# Altium footprint library ZHZ_Balance.PcbLib: 29 footprints (part 1 of 2)
Each footprint in its own frame and in the unit in brackets; x right, y up, seen from the top. Pads: shape width x height; smd on the part's side, far side on the other; paste and mask are expansions set on the pad; w line width, h text height; cw(c..) or ccw(c..) is an arc to the next point about the centre after c.
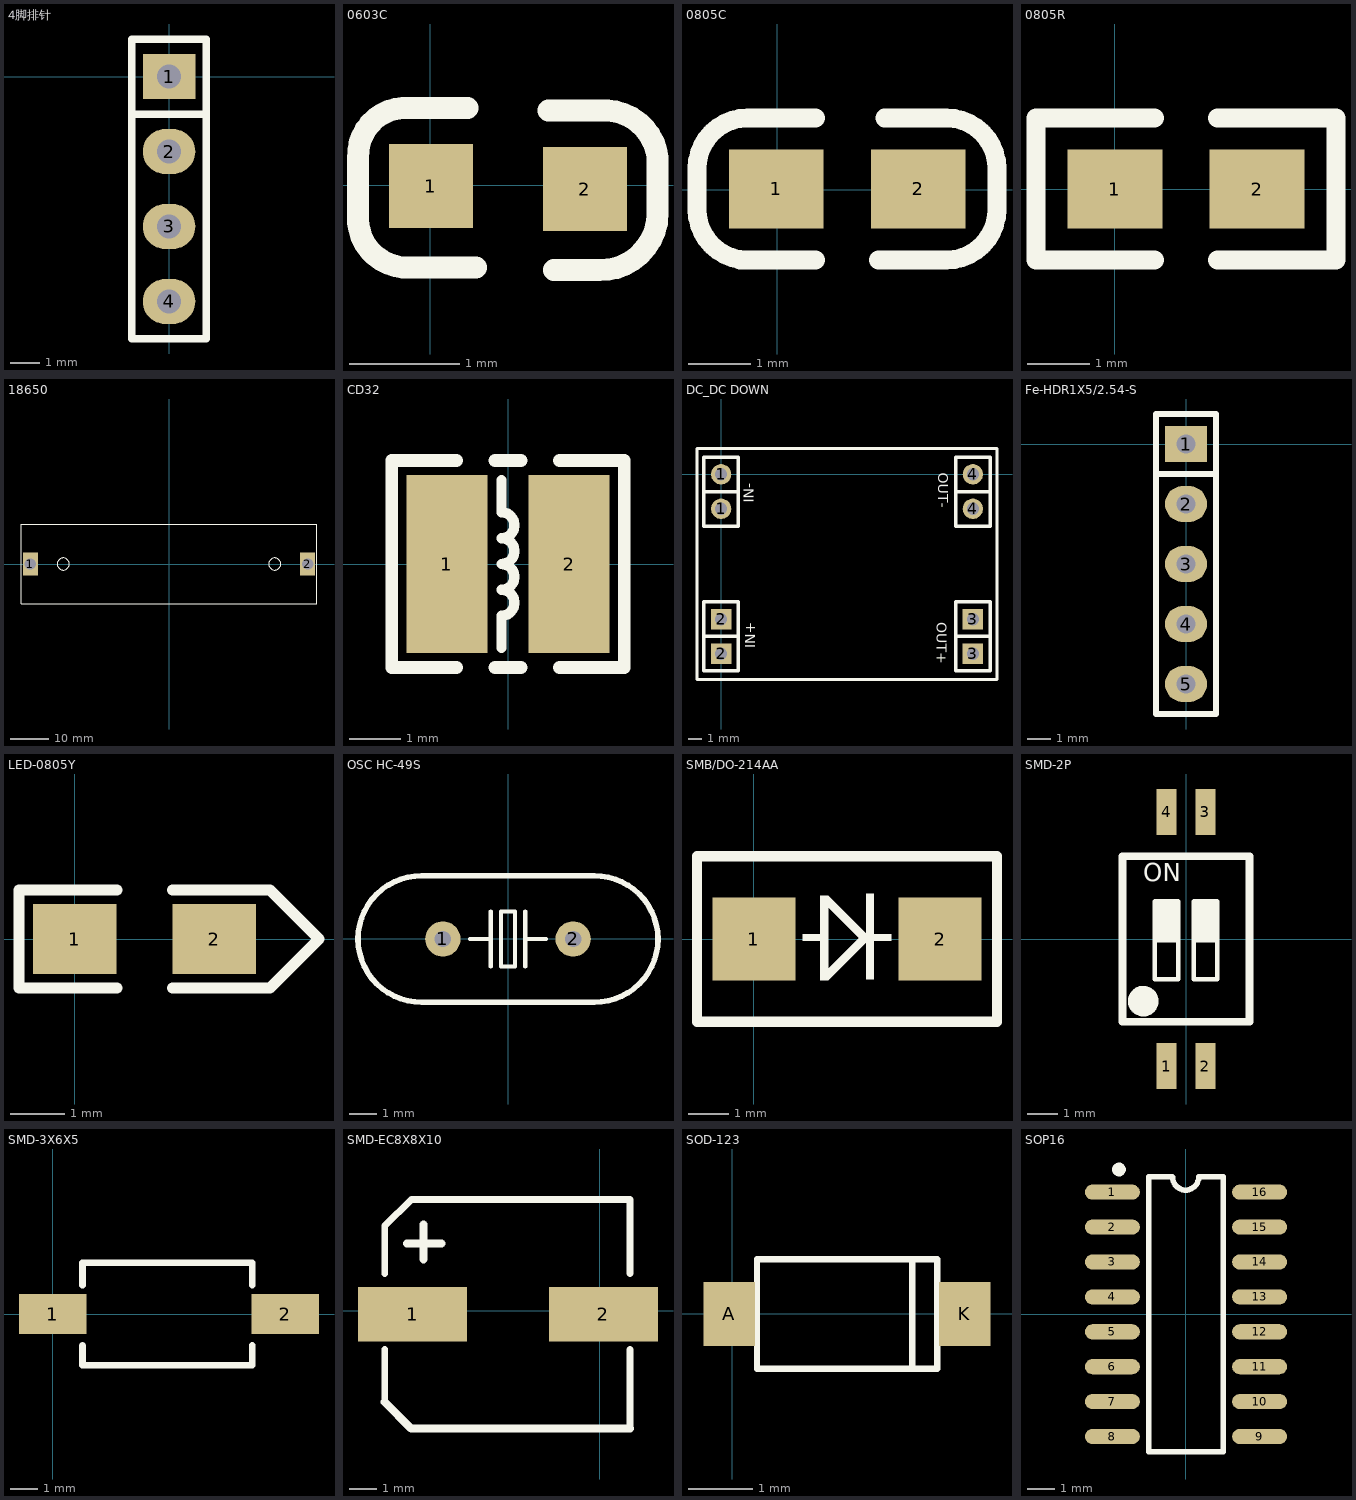
[diagram p0: the footprints below, top view; thin cyan lines are the x and y axes]

## 4脚排针 [mil]
pads (4):
  rect 70x60 hole 32: 1(0,0)
  oval 70x60 hole 32: 2(0,-100) 3(0,-200) 4(0,-300)
Top Overlay:
  lines w10: -50,-50 50,-50 ; -50,-350 -50,50 50,50 50,-350 -50,-350
3D body "1001-4.STEP": height 336.22, standoff -118.11, extent -49.99,-350 50.01,50

## 0603C [mil]
height 51.18
pads (2):
  rect 30x30 smd: 1(0.21,-0.35) 2(55.21,-1.35)
Top Overlay:
  lines w7.87: 13.21,27.65 -9.79,27.65 ccw(c-8.79,10.65) -25.79,9.65 -25.79,-10.35 ccw(c-8.29,-11.85) -9.79,-29.35 16.21,-29.35 ; 42.21,26.65 60.21,26.65 cw(c62.21,7.65) 81.21,9.65 81.21,-10.35 cw(c60.71,-9.85) 60.21,-30.35 44.21,-30.35
3D body "0603 SMD Capacitor.STEP": height 11.89, standoff 0, extent -1.49,-14.99 61.5,16.5

## 0805C [mil]
height 51.18
pads (2):
  rect 60x50 smd: 1(-0.71,0.4) 2(89.29,0.4)
Top Overlay:
  lines w12: -50.85,12.26 -50.85,-12.6 ccw(c-18.71,-12.6) -18.71,-44.74 ; -50.85,13.26 cw(c-18.71,13.26) -18.71,45.4 24.29,45.4 ; -23.71,-44.6 24.29,-44.6 ; 64.29,-44.6 107.29,-44.6 ; 68.15,45.4 107.15,45.4 cw(c107.15,13.26) 139.29,13.26 139.29,-11.6 ; 107.15,-44.74 ccw(c107.15,-12.6) 139.29,-12.6
3D body "0805 SMD Capacitor.STEP": height 0, standoff -30.79, extent 5.63,-24.61 84.37,24.6

## 0805R [mil]
height 51.18
pads (2):
  rect 60x50 smd: 1(0,0) 2(90,0)
Top Overlay:
  lines w12: 25,-45 -50,-45 -50,45 25,45 ; 65,-45 140,-45 140,45 65,45
3D body "RES0805.STEP": height 15, standoff -1.14, extent 1.26,-24.6 80,24.61

## 18650 [mm]
height 70
pads (2):
  rect 4x6 hole 3 square: 1(-36.45,0) 2(36.45,0)
Top Overlay:
  circle w0.254: c-27.805,0 r1.6
  circle w0.254: c27.805,0 r1.6
  lines w0.254: -38.85,-10.45 -38.85,10.45 38.85,10.45 38.85,-10.45 -38.85,-10.45
3D body "18650电池盒.STEP": height 21.65, standoff -3.83, extent -38.828,-10.273 38.822,10.527
3D body "18650电池盒.STEP": height 21.65, standoff -3.83, extent -38.828,-10.273 38.822,10.527

## CD32 [mm] "3.5*3*2mm（长宽高）"
pads (2):
  rect 1.6x3.5 smd: 1(-1.2,0) 2(1.2,0)
Top Overlay:
  lines w0.203: -0.127,-1.651 -0.127,-1.016 ccw(c-0.127,-0.762) -0.127,-0.508 ccw(c-0.127,-0.254) -0.127,0 ccw(c-0.127,0.254) -0.127,0.508 ccw(c-0.127,0.762) -0.127,1.016 -0.127,1.651
  lines w0.254: -1.016,-2.032 -2.286,-2.032 -2.286,2.032 -1.016,2.032 ; -0.254,-2.032 0.254,-2.032 ; -0.254,2.032 0.254,2.032 ; 1.016,-2.032 2.286,-2.032 2.286,2.032 1.016,2.032
3D body "CD32.STEP": height 2.15, standoff 0.05, extent -1.707,-1.5 1.707,1.5

## DC_DC DOWN [mm]
height 12
pads (8):
  round 1.5 hole 0.9: 1(0,-2.54) 1(0,0) 4(18.542,-2.54) 4(18.542,0)
  rect 1.5x1.5 hole 0.9: 2(0,-13.208) 2(0,-10.668) 3(18.542,-13.208) 3(18.542,-10.668)
Top Overlay:
  lines w0.254: -1.27,-11.938 1.27,-11.938 ; -1.27,-1.27 1.27,-1.27 ; 17.272,-11.938 19.812,-11.938 ; 17.272,-1.27 19.812,-1.27 ; -1.778,-15.113 -1.778,1.905 20.32,1.905 20.32,-15.113 -1.778,-15.113 ; -1.27,-14.478 1.27,-14.478 1.27,-9.398 -1.27,-9.398 -1.27,-14.478 ; -1.27,-3.81 -1.27,1.27 1.27,1.27 1.27,-3.81 -1.27,-3.81 ; 17.272,-14.478 19.812,-14.478 19.812,-9.398 17.272,-9.398 17.272,-14.478 ; 17.272,-3.81 19.812,-3.81 19.812,1.27 17.272,1.27 17.272,-3.81
  text "IN-" at 2.4,-2.1 h0.76
  text "IN+" at 2.5,-12.8 h0.76
  text "OUT-" at 16,0.1 h0.76
  text "OUT+" at 15.9,-10.9 h0.76

## Fe-HDR1X5/2.54-S [mil]
pads (5):
  rect 70x60 hole 32: 1(0,0)
  oval 70x60 hole 32: 2(0,-100) 3(0,-200) 4(0,-300) 5(0,-400)
Top Overlay:
  lines w10: -50,-50 50,-50 ; -50,-450 -50,50 50,50 50,-450 -50,-450
3D body "Female-Header-2.54-Single-5.stp": height 125.98, standoff -334.65, extent -50,-454.92 48.43,54.92

## LED-0805Y [mil]
height 51.18
pads (2):
  rect 60x50 smd: 1(0,0) 2(100,0)
Top Overlay:
  lines w8: 30,-35 -40,-35 -40,35 30,35 ; 70,-35 140,-35 175,0 140,35 70,35
3D body "m.STEP": height 31.69, standoff -0.04, extent 10.63,-26.12 89.37,23.17

## OSC HC-49S [mm]
height 1.3
pads (2):
  round 1.3 hole 0.6: 1(-2.4,0) 2(2.4,0)
Top Overlay:
  lines w0.152: -1.397,0 -0.635,0 ; -0.635,-1.016 -0.635,1.016 ; 0.635,-1.016 0.635,1.016 ; 0.635,0 1.397,0 ; -0.254,-1.016 -0.254,1.016 0.254,1.016 0.254,-1.016 -0.254,-1.016
  lines w0.203: -3.175,2.325 ccw(c-3.2,0) -3.173,-2.325 3.175,-2.325 ccw(c3.2,0) 3.173,2.325 -3.175,2.325
3D body "OSC HC-49S.STEP": height 4.13, standoff -3.45, extent -5.525,-2.286 5.525,2.364

## SMB/DO-214AA [mil] "塑封二极管"
pads (2):
  rect 80x80 smd: 1(0,0) 2(180,0)
Top Overlay:
  region: 111.61,-0.46 105.61,5.55 66.03,-34.03 72.04,-40.04
  rectangle: 64,-40 72,42
  rectangle: 108.5,-39 116,44
  region: 65,-2 65,5 47,5 47,-2
  region: 105.57,-3.58 111.58,2.42 72,42 65.99,35.99
  region: 133,-2 133,5 114,5 114,-2
  lines w10: -55,-80 235,-80 235,80 -55,80 -55,-80
3D body "DO-214AA.STEP": height 98.43, standoff 0, extent -20.24,-78.54 200.24,75

## SMD-2P [mm] "长：4.14mm，宽：5.4mm，高：2.3mm"
pads (4):
  rect 0.65x1.5 smd: 1(-0.635,-4.15) 2(0.635,-4.15) 3(0.635,4.15) 4(-0.635,4.15)
Top Overlay:
  circle w0.5: c-1.397,-2.032 r0.25
  region: 1.016,1.225 0.254,1.225 0.254,-0.045 1.016,-0.045
  region: -0.254,1.225 -1.016,1.225 -1.016,-0.045 -0.254,-0.045
  lines w0.15: -1.016,-0.045 -0.254,-0.045 ; 0.254,-0.045 1.016,-0.045 ; -1.016,-1.315 -1.016,1.225 -0.254,1.225 -0.254,-1.315 -1.016,-1.315 ; 0.254,-1.315 0.254,1.225 1.016,1.225 1.016,-1.315 0.254,-1.315
  lines w0.254: -2.07,-2.7 2.07,-2.7 2.07,2.7 -2.07,2.7 -2.07,-2.7
  text "ON" at -1.397,1.696 h1
3D body "SMD-2P.STEP": height 2.35, standoff 0, extent -2.108,-4.477 2.032,4.223

## SMD-3X6X5 [mm]
height 1.3
pads (2):
  rect 2.5x1.5 smd: 1(0,0) 2(8.636,0)
Top Overlay:
  lines w0.254: 1.106,-1.168 1.106,-1.9 7.406,-1.9 7.406,-1.168 ; 1.106,1.067 1.106,1.9 7.406,1.9 7.406,1.067
3D body "SMD-3X6X5.STEP": height 5.1, standoff -0.03, extent -0.409,-1.722 8.791,1.778

## SMD-EC8X8X10 [mm]
pads (2):
  rect 4x2 smd: 1(-6.858,-0.127) 2(0.142,-0.127)
Top Overlay:
  lines w0.254: -7.878,-1.422 -7.878,-3.349 -6.909,-4.318 1.118,-4.318 1.118,-1.422 ; -7.878,1.372 -7.878,3.108 -6.904,4.082 1.118,4.082 1.118,1.372
  lines w0.3: -7.878,-3.344 -7.878,-3.349 -6.909,-4.318 1.118,-4.318 ; -7.061,2.473 -5.791,2.473 ; -6.452,1.889 -6.452,3.159
3D body "ALU-F_8.0x8.3x10.2.STEP": height 10.2, standoff 0, extent -8.379,-4.277 1.521,4.023

## SOD-123 [mm] "塑封二极管"
pads (2):
  rect 0.8x1 smd: A(-0.051,0) K(3.607,0)
Top Overlay:
  lines w0.1: 2.794,-0.85 2.794,0.85 ; 0.381,-0.85 0.381,0.85 3.181,0.85 3.181,-0.85 0.381,-0.85
3D body "SOD-123_DiodesInc.STEP": height 1.43, standoff -0.02, extent -0.122,-0.889 3.728,0.811

## SOP16 [mm] "（蒜米工坊）"
height 1.75
pads (16):
  oval 2x0.55 smd: 1(-2.667,4.445) 2(-2.667,3.175) 3(-2.667,1.905) 4(-2.667,0.635) 5(-2.667,-0.635) 6(-2.667,-1.905) 7(-2.667,-3.175) 8(-2.667,-4.445) 9(2.692,-4.445) 10(2.692,-3.175) 11(2.692,-1.905) 12(2.692,-0.635) 13(2.692,0.635) 14(2.692,1.905) 15(2.692,3.175) 16(2.692,4.445)
Top Overlay:
  circle w0.25: c-2.425,5.27 r0.125
  lines w0.2: -0.483,5 -1.346,5 -1.346,-5 1.372,-5 1.372,5 0.475,5 ; -0.475,4.997 ccw(c0,4.996) 0.475,4.997
3D body "SO-16.STEP": height 1.45, standoff 0, extent -2.921,-4.991 2.984,4.991